# Altium footprint library OBC Development Board.PcbLib: 53 footprints (part 3 of 4)
Each footprint in its own frame and in the unit in brackets; x right, y up, seen from the top. Pads: shape width x height; smd on the part's side, far side on the other; paste and mask are expansions set on the pad; w line width, h text height; cw(c..) or ccw(c..) is an arc to the next point about the centre after c.
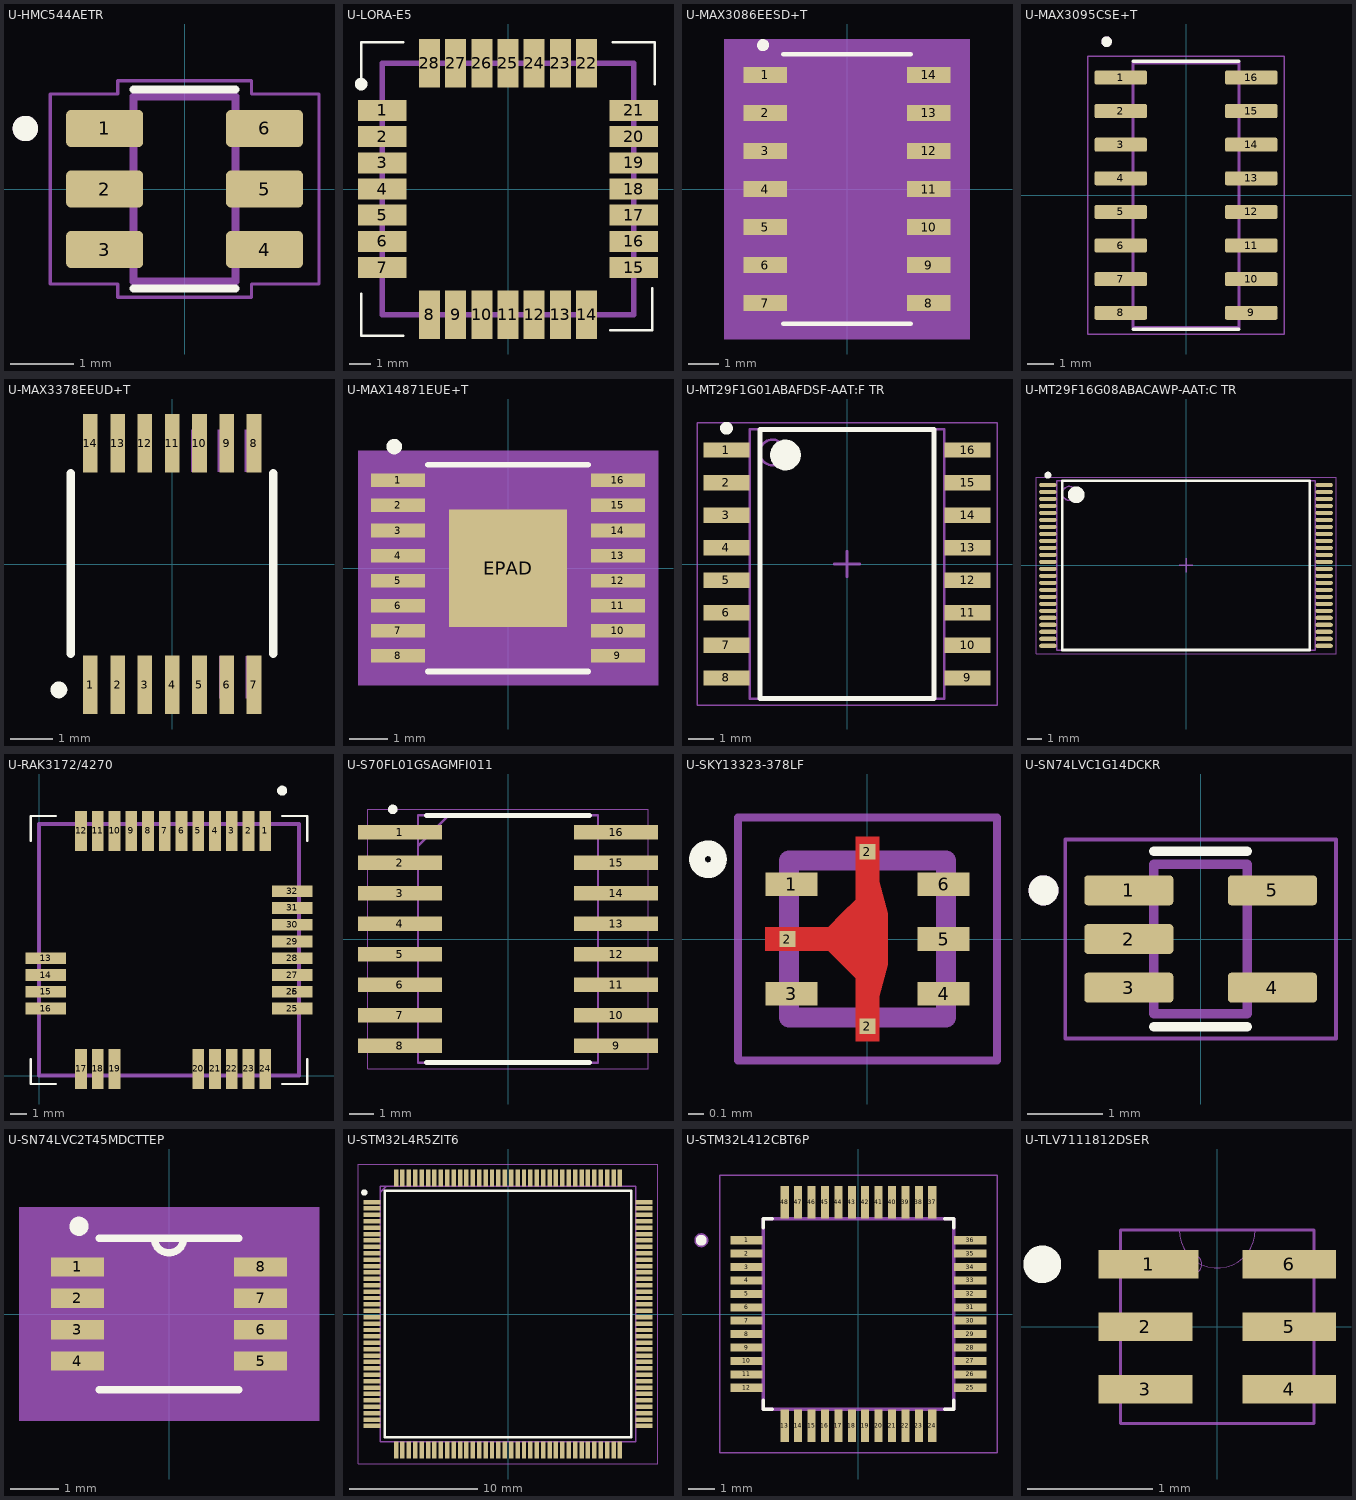
[diagram p2: the footprints below, top view; thin cyan lines are the x and y axes]

## U-HMC544AETR [mm]
pads (6):
  rrect25% 1.21x0.58 smd: 1(-1.255,0.95) 2(-1.255,0) 3(-1.255,-0.95) 4(1.255,-0.95) 5(1.255,0) 6(1.255,0.95)
Top Overlay:
  circle w0.2: c-2.5,0.95 r0.1
  lines w0.127: -0.8,-1.56 0.8,-1.56 ; -0.8,1.56 0.8,1.56
Mechanical 13:
  circle w0.2: c-2.5,0.95 r0.1
  lines w0.127: -0.8,-1.45 0.8,-1.45 0.8,1.45 -0.8,1.45 -0.8,-1.45
Mechanical 15:
  lines w0.05: -2.11,-1.49 -1.05,-1.49 -1.05,-1.7 1.05,-1.7 1.05,-1.49 2.11,-1.49 2.11,1.49 1.05,1.49 1.05,1.7 -1.05,1.7 -1.05,1.49 -2.11,1.49 -2.11,-1.49
3D body "HMC544AE (1).STEP": height 1.45, standoff 0, extent -1.4,-1.45 1.4,1.45

## U-LORA-E5 [mm]
pads (28):
  rrect0% 2.3x1 smd: 1(-6,3.75) 2(-6,2.5) 3(-6,1.25) 4(-6,0) 5(-6,-1.25) 6(-6,-2.5) 7(-6,-3.75) 15(6,-3.75) 16(6,-2.5) 17(6,-1.25) 18(6,0) 19(6,1.25) 20(6,2.5) 21(6,3.75)
  rrect0% 1x2.3 smd: 8(-3.75,-6) 9(-2.5,-6) 10(-1.25,-6) 11(0,-6) 12(1.25,-6) 13(2.5,-6) 14(3.75,-6) 22(3.75,6) 23(2.5,6) 24(1.25,6) 25(0,6) 26(-1.25,6) 27(-2.5,6) 28(-3.75,6)
Top Overlay:
  circle w0.4: c-7,5 r0.1
  lines w0.127: -7,-5 -7,-7 -5,-7 ; -7,5 -7,7 -5,7 ; 4.884,-6.73 6.884,-6.73 6.884,-4.73 ; 5,7 7,7 7,5
Mechanical 13:
  lines w0.254: -6,-6 6,-6 6,6 -6,6 -6,-6
3D body: height 2.5, standoff 0, extent -6,-6 6,6

## U-MAX3086EESD+T [mil]
pads (14):
  rect 57.5x21 smd paste+0 mask+0: 1(-107.25,150) 2(-107.25,100) 3(-107.25,50) 4(-107.25,0) 5(-107.25,-50) 6(-107.25,-100) 7(-107.25,-150) 8(107.25,-150) 9(107.25,-100) 10(107.25,-50) 11(107.25,0) 12(107.25,50) 13(107.25,100) 14(107.25,150)
Top Overlay:
  circle w7.87: c-110.24,188.98 r3.94
  lines w6: -83.5,-177 83.5,-177 ; -83.5,177 83.5,177
Mechanical 5:
  region: 161,-197 -161,-197 -161,197 161,197
Mechanical 13:
  lines w0: -12,172 ccw(c0,172) 12,172
  lines w1: -122,-159.5 -78.5,-159.5 -78.5,-140.5 -122,-140.5 -122,-159.5 ; -122,-109.5 -78.5,-109.5 -78.5,-90.5 -122,-90.5 -122,-109.5 ; -122,-59.5 -78.5,-59.5 -78.5,-40.5 -122,-40.5 -122,-59.5 ; -122,-9.5 -78.5,-9.5 -78.5,9.5 -122,9.5 -122,-9.5 ; -122,40.5 -78.5,40.5 -78.5,59.5 -122,59.5 -122,40.5 ; -122,90.5 -78.5,90.5 -78.5,109.5 -122,109.5 -122,90.5 ; -122,140.5 -78.5,140.5 -78.5,159.5 -122,159.5 -122,140.5 ; -78.5,-172 -78.5,172 78.5,172 78.5,-172 -78.5,-172 ; 78.5,-159.5 122,-159.5 122,-140.5 78.5,-140.5 78.5,-159.5 ; 78.5,-109.5 122,-109.5 122,-90.5 78.5,-90.5 78.5,-109.5 ; 78.5,-59.5 122,-59.5 122,-40.5 78.5,-40.5 78.5,-59.5 ; 78.5,-9.5 122,-9.5 122,9.5 78.5,9.5 78.5,-9.5 ; 78.5,40.5 122,40.5 122,59.5 78.5,59.5 78.5,40.5 ; 78.5,90.5 122,90.5 122,109.5 78.5,109.5 78.5,90.5 ; 78.5,140.5 122,140.5 122,159.5 78.5,159.5 78.5,140.5
  text "*" at -76,119 h50
3D body "21-0041B_14_MXM.step": height 69.09, standoff 0, extent -122.01,-172.01 122.01,172
3D body: height 10, standoff 0, extent 0,0 10,10

## U-MAX3095CSE+T [mm]
pads (16):
  rrect25% 1.98x0.53 smd: 1(-2.465,4.445) 2(-2.465,3.175) 3(-2.465,1.905) 4(-2.465,0.635) 5(-2.465,-0.635) 6(-2.465,-1.905) 7(-2.465,-3.175) 8(-2.465,-4.445) 9(2.465,-4.445) 10(2.465,-3.175) 11(2.465,-1.905) 12(2.465,-0.635) 13(2.465,0.635) 14(2.465,1.905) 15(2.465,3.175) 16(2.465,4.445)
Top Overlay:
  circle w0.2: c-3,5.8 r0.1
  lines w0.127: -2,-5.06 2,-5.06 ; -2,5.06 2,5.06
Mechanical 13:
  circle w0.2: c-3,5.8 r0.1
  lines w0.127: -2,-5 2,-5 2,5 -2,5 -2,-5
Mechanical 15:
  lines w0.05: -3.71,-5.25 3.71,-5.25 3.71,5.25 -3.71,5.25 -3.71,-5.25
3D body "MAX3095CSE+T.STEP": height 1.75, standoff 0, extent -3,-4.95 3,4.95

## U-MAX3378EEUD+T [mm]
pads (14):
  rect 0.35x1.4 smd: 1(-1.95,-2.875) 2(-1.3,-2.875) 3(-0.65,-2.875) 4(0,-2.875) 5(0.65,-2.875) 6(1.3,-2.875) 7(1.95,-2.875) 8(1.95,2.875) 9(1.3,2.875) 10(0.65,2.875) 11(0,2.875) 12(-0.65,2.875) 13(-1.3,2.875) 14(-1.95,2.875)
Top Overlay:
  circle w0.2: c-2.7,-3 r0.1
  lines w0.2: -2.413,-2.141 -2.413,2.159 ; 2.413,-2.141 2.413,2.159
Mechanical 13:
  region: -1.835,-3.2 -2.085,-3.2 -2.085,-2.2 -1.835,-2.2
  region: -1.185,-3.2 -1.435,-3.2 -1.435,-2.2 -1.185,-2.2
  region: -0.535,-3.2 -0.785,-3.2 -0.785,-2.2 -0.535,-2.2
  region: 0.115,-3.2 -0.135,-3.2 -0.135,-2.2 0.115,-2.2
  region: 0.115,2.2 -0.135,2.2 -0.135,3.2 0.115,3.2
  region: -0.535,2.2 -0.785,2.2 -0.785,3.2 -0.535,3.2
  region: -1.185,2.2 -1.435,2.2 -1.435,3.2 -1.185,3.2
  region: -1.835,2.2 -2.085,2.2 -2.085,3.2 -1.835,3.2
  region: 0.735,-3.2 0.485,-3.2 0.485,-2.2 0.735,-2.2
  region: 1.37,-3.2 1.12,-3.2 1.12,-2.2 1.37,-2.2
  region: 2.005,-3.2 1.755,-3.2 1.755,-2.2 2.005,-2.2
  region: 1.34,2.2 1.09,2.2 1.09,3.2 1.34,3.2
  region: 1.975,2.2 1.725,2.2 1.725,3.2 1.975,3.2
  region: 0.705,2.2 0.455,2.2 0.455,3.2 0.705,3.2
3D body "step_temp.STEP": height 1.1, standoff 0, extent -2.5,-3.175 2.5,3.225

## U-MAX14871EUE+T [mm]
pads (17):
  rect 1.4x0.35 smd paste+0 mask+0: 1(-2.845,2.275) 2(-2.845,1.625) 3(-2.845,0.975) 4(-2.845,0.325) 5(-2.845,-0.325) 6(-2.845,-0.975) 7(-2.845,-1.625) 8(-2.845,-2.275) 9(2.845,-2.275) 10(2.845,-1.625) 11(2.845,-0.975) 12(2.845,-0.325) 13(2.845,0.325) 14(2.845,0.975) 15(2.845,1.625) 16(2.845,2.275)
  rect 3.05x3.05 smd paste-1.537 mask+0: EPAD(0,0)
Top Overlay:
  circle w0.2: c-2.946,3.15 r0.1
  lines w0.152: -2.069,-2.68 2.069,-2.68 ; -2.069,2.68 2.069,2.68
Top Paste:
  region: 1.449,-0.1 0.1,-0.1 0.1,-1.449 1.449,-1.449
  region: 1.449,1.449 0.1,1.449 0.1,0.1 1.449,0.1
  region: -0.1,-0.1 -1.449,-0.1 -1.449,-1.449 -0.1,-1.449
  region: -0.1,1.449 -1.449,1.449 -1.449,0.1 -0.1,0.1
Mechanical 5:
  region: 3.886,-3.035 -3.886,-3.035 -3.886,3.035 3.886,3.035
Mechanical 13:
  lines w0: -0.305,2.553 ccw(c0,2.553) 0.305,2.553
  lines w0.025: -3.251,-2.427 -2.248,-2.427 -2.248,-2.123 -3.251,-2.123 -3.251,-2.427 ; -3.251,-1.777 -2.248,-1.777 -2.248,-1.473 -3.251,-1.473 -3.251,-1.777 ; -3.251,-1.127 -2.248,-1.127 -2.248,-0.823 -3.251,-0.823 -3.251,-1.127 ; -3.251,-0.477 -2.248,-0.477 -2.248,-0.173 -3.251,-0.173 -3.251,-0.477 ; -3.251,0.173 -2.248,0.173 -2.248,0.477 -3.251,0.477 -3.251,0.173 ; -3.251,0.823 -2.248,0.823 -2.248,1.127 -3.251,1.127 -3.251,0.823 ; -3.251,1.473 -2.248,1.473 -2.248,1.777 -3.251,1.777 -3.251,1.473 ; -3.251,2.123 -2.248,2.123 -2.248,2.427 -3.251,2.427 -3.251,2.123 ; -2.248,-2.553 -2.248,2.553 2.248,2.553 2.248,-2.553 -2.248,-2.553 ; 2.248,-2.427 3.251,-2.427 3.251,-2.123 2.248,-2.123 2.248,-2.427 ; 2.248,-1.777 3.251,-1.777 3.251,-1.473 2.248,-1.473 2.248,-1.777 ; 2.248,-1.127 3.251,-1.127 3.251,-0.823 2.248,-0.823 2.248,-1.127 ; 2.248,-0.477 3.251,-0.477 3.251,-0.173 2.248,-0.173 2.248,-0.477 ; 2.248,0.173 3.251,0.173 3.251,0.477 2.248,0.477 2.248,0.173 ; 2.248,0.823 3.251,0.823 3.251,1.127 2.248,1.127 2.248,0.823 ; 2.248,1.473 3.251,1.473 3.251,1.777 2.248,1.777 2.248,1.473 ; 2.248,2.123 3.251,2.123 3.251,2.427 2.248,2.427 2.248,2.123
  text "*" at -2.184,1.206 h1.27
3D body "21-0108_U16E+3_MXM.step": height 1.09, standoff -0.05, extent -3.251,-2.553 3.251,2.553

## U-MT29F1G01ABAFDSF-AAT:F TR [mm]
height 2.65
pads (16):
  rect 1.8x0.6 smd: 1(-4.7,4.445) 2(-4.7,3.175) 3(-4.7,1.905) 4(-4.7,0.635) 5(-4.7,-0.635) 6(-4.7,-1.905) 7(-4.7,-3.175) 8(-4.7,-4.445) 9(4.7,-4.445) 10(4.7,-3.175) 11(4.7,-1.905) 12(4.7,-0.635) 13(4.7,0.635) 14(4.7,1.905) 15(4.7,3.175) 16(4.7,4.445)
Top Overlay:
  circle w0.25: c-4.7,5.295 r0.125
  circle w0.6: c-2.4,4.25 r0.3
  lines w0.2: -3.4,-5.25 -3.4,5.25 3.4,5.25 3.4,-5.25 -3.4,-5.25
Mechanical 13:
  circle w0.1: c-2.9,4.35 r0.5
  lines w0.1: -3.8,-5.25 -3.8,5.25 3.8,5.25 3.8,-5.25 -3.8,-5.25
Mechanical 15:
  lines w0.05: -5.85,-5.5 -5.85,5.5 5.85,5.5 5.85,-5.5 -5.85,-5.5
  lines w0.1: -0.5,0 0.5,0 ; 0,-0.5 0,0.5
3D body "F TR.step": height 2.65, standoff 0, extent -5.15,-5.25 5.15,5.25

## U-MT29F16G08ABACAWP-AAT:C TR [mm] "TSSOP, 48-Leads, Body 12.00x18.40mm, Pitch 0.50mm, IPC Medium Density"
height 1.2
pads (48):
  oval 1.25x0.3 smd: 1(-9.875,5.75) 2(-9.875,5.25) 3(-9.875,4.75) 4(-9.875,4.25) 5(-9.875,3.75) 6(-9.875,3.25) 7(-9.875,2.75) 8(-9.875,2.25) 9(-9.875,1.75) 10(-9.875,1.25) 11(-9.875,0.75) 12(-9.875,0.25) 13(-9.875,-0.25) 14(-9.875,-0.75) 15(-9.875,-1.25) 16(-9.875,-1.75) 17(-9.875,-2.25) 18(-9.875,-2.75) 19(-9.875,-3.25) 20(-9.875,-3.75) 21(-9.875,-4.25) 22(-9.875,-4.75) 23(-9.875,-5.25) 24(-9.875,-5.75) 25(9.875,-5.75) 26(9.875,-5.25) 27(9.875,-4.75) 28(9.875,-4.25) 29(9.875,-3.75) 30(9.875,-3.25) 31(9.875,-2.75) 32(9.875,-2.25) 33(9.875,-1.75) 34(9.875,-1.25) 35(9.875,-0.75) 36(9.875,-0.25) 37(9.875,0.25) 38(9.875,0.75) 39(9.875,1.25) 40(9.875,1.75) 41(9.875,2.25) 42(9.875,2.75) 43(9.875,3.25) 44(9.875,3.75) 45(9.875,4.25) 46(9.875,4.75) 47(9.875,5.25) 48(9.875,5.75)
Top Overlay:
  circle w0.25: c-9.875,6.45 r0.125
  circle w0.6: c-7.85,5.05 r0.3
  lines w0.2: -8.85,-6.05 -8.85,6.05 8.85,6.05 8.85,-6.05 -8.85,-6.05
Mechanical 13:
  circle w0.1: c-8.35,5.15 r0.5
  lines w0.1: -9.25,-6.05 -9.25,6.05 9.25,6.05 9.25,-6.05 -9.25,-6.05
Mechanical 15:
  lines w0.05: -10.725,-6.3 -10.725,6.3 10.725,6.3 10.725,-6.3 -10.725,-6.3
  lines w0.1: -0.5,0 0.5,0 ; 0,-0.5 0,0.5
3D body "C TR 1.step": height 1.2, standoff 0, extent -10,-6.05 10,6.05

## U-RAK3172/4270 [mm]
pads (33):
  rrect0% 0.7x2.4 smd: 1(13.5,14.6) 2(12.5,14.6) 3(11.5,14.6) 4(10.5,14.6) 5(9.5,14.6) 6(8.5,14.6) 7(7.5,14.6) 8(6.5,14.6) 9(5.5,14.6) 10(4.5,14.6) 11(3.5,14.6) 12(2.5,14.6) 17(2.5,0.4) 18(3.5,0.4) 19(4.5,0.4) 20(9.5,0.4) 21(10.5,0.4) 22(11.5,0.4) 23(12.5,0.4) 24(13.5,0.4)
  rrect0% 2.4x0.7 smd: 13(0.4,7) 14(0.4,6) 15(0.4,5) 16(0.4,4) 25(15.1,4) 25(15.1,5) 26(15.1,5) 27(15.1,6) 28(15.1,7) 29(15.1,8) 30(15.1,9) 31(15.1,10) 32(15.1,11)
Top Overlay:
  circle w0.4: c14.5,17 r0.1
  lines w0.127: -0.5,1 -0.5,-0.5 1,-0.5 ; -0.5,14 -0.5,15.5 1,15.5 ; 14.5,-0.5 16,-0.5 16,1 ; 14.5,15.5 16,15.5 16,14
Mechanical 13:
  lines w0.254: -0.001,0.019 -0.001,15.019 15.499,15.019 ; 0,0 15.5,0 15.5,15
3D body: height 1.27, standoff -1.27, extent 0,0 15.5,15

## U-S70FL01GSAGMFI011 [mm]
pads (16):
  rect 3.5x0.6 smd: 1(-4.5,4.445) 2(-4.5,3.175) 3(-4.5,1.905) 4(-4.5,0.635) 5(-4.5,-0.635) 6(-4.5,-1.905) 7(-4.5,-3.175) 8(-4.5,-4.445) 9(4.5,-4.445) 10(4.5,-3.175) 11(4.5,-1.905) 12(4.5,-0.635) 13(4.5,0.635) 14(4.5,1.905) 15(4.5,3.175) 16(4.5,4.445)
Top Overlay:
  circle w0.2: c-4.8,5.4 r0.1
  lines w0.2: -3.4,-5.15 3.4,-5.15 ; -3.4,5.15 3.4,5.15
Mechanical 13:
  lines w0.1: -3.75,3.88 -2.48,5.15 ; -3.75,-5.15 3.75,-5.15 3.75,5.15 -3.75,5.15 -3.75,-5.15
Mechanical 15:
  lines w0.05: -5.85,-5.4 5.85,-5.4 5.85,5.4 -5.85,5.4 -5.85,-5.4
3D body "S70FL01GSAGMFI011.stp": height 2.65, standoff 0, extent -5.15,-5.15 5.15,5.15

## U-SKY13323-378LF [mm]
pads (8):
  rect 0.33x0.15 smd: 1(-0.485,0.35) 3(-0.485,-0.35) 4(0.485,-0.35) 5(0.485,0) 6(0.485,0.35)
  rect 0.1x0.1 smd paste-1 mask+0: 2(-0.51,0) 2(0,-0.555) 2(0,0.555)
Top Layer:
  region: 0.075,0.365 -0.075,0.25 -0.075,0.65 0.075,0.65
  region: 0.075,-0.65 -0.075,-0.65 -0.075,-0.365 0.075,-0.365
  region: 0.13,0.165 0.13,-0.165 0.075,-0.365 -0.075,-0.365 -0.075,-0.25 -0.25,-0.075 -0.25,0.075 -0.162,0.162 -0.075,0.25 0.075,0.365
  region: -0.25,-0.075 -0.65,-0.075 -0.65,0.075 -0.25,0.075
Top Overlay:
  circle w0.1: c-1.016,0.508 r0.07
Top Paste:
  region: 0.075,0.365 -0.075,0.25 -0.075,0.65 0.075,0.65
  region: 0.075,-0.65 -0.075,-0.65 -0.075,-0.365 0.075,-0.365
  region: 0.13,0.165 0.13,-0.165 0.075,-0.365 -0.075,-0.365 -0.075,-0.25 -0.25,-0.075 -0.25,0.075 -0.162,0.162 -0.075,0.25 0.075,0.365
  region: -0.25,-0.075 -0.65,-0.075 -0.65,0.075 -0.25,0.075
Top Solder:
  region: 0.1,0.375 0.15,0.175 0.15,-0.175 0.1,-0.375 0.1,-0.675 -0.1,-0.675 -0.1,-0.25 -0.25,-0.1 -0.675,-0.1 -0.675,0.1 -0.25,0.1 -0.1,0.25 -0.1,0.675 0.1,0.675
Mechanical 13:
  lines w0.127: -0.5,-0.5 0.5,-0.5 0.5,0.5 -0.5,0.5 -0.5,-0.5
Mechanical 15:
  lines w0.05: -0.825,-0.775 0.825,-0.775 0.825,0.775 -0.825,0.775 -0.825,-0.775
3D body "SKY13323-378LF.STEP": height 0.5, standoff 0, extent -0.5,-0.5 0.5,0.5

## U-SN74LVC1G14DCKR [mm]
pads (5):
  rrect25% 1.19x0.4 smd: 1(-0.96,0.65) 2(-0.96,0) 3(-0.96,-0.65) 4(0.96,-0.65) 5(0.96,0.65)
Top Overlay:
  circle w0.2: c-2.1,0.65 r0.1
  lines w0.127: -0.625,-1.17 0.625,-1.17 ; -0.625,1.17 0.625,1.17
Mechanical 13:
  circle w0.2: c-2.1,0.65 r0.1
  lines w0.127: -0.625,-1 -0.625,1 0.625,1 0.625,-1 -0.625,-1
Mechanical 15:
  lines w0.05: -1.81,-1.33 -1.81,1.33 1.81,1.33 1.81,-1.33 -1.81,-1.33
3D body "SN74LVC1G14DCKR.STEP": height 1.1, standoff 0, extent -1.05,-1 1.05,1

## U-SN74LVC2T45MDCTTEP [mm]
pads (8):
  rect 1.1x0.4 smd: 1(-1.9,0.975) 2(-1.9,0.325) 3(-1.9,-0.325) 4(-1.9,-0.975) 5(1.9,-0.975) 6(1.9,-0.325) 7(1.9,0.325) 8(1.9,0.975)
Top Overlay:
  circle w0.2: c-1.867,1.819 r0.1
  lines w0.152: -1.448,-1.575 1.448,-1.575 ; -1.448,1.575 1.448,1.575 ; -0.305,1.575 ccw(c0,1.575) 0.305,1.575
Mechanical 5:
  region: 3.111,-2.21 -3.111,-2.21 -3.111,2.21 3.111,2.21
Mechanical 13:
  lines w0: -0.305,1.575 ccw(c0,1.575) 0.305,1.575
  lines w0.025: -2.121,-1.127 -1.448,-1.127 -1.448,-0.823 -2.121,-0.823 -2.121,-1.127 ; -2.121,-0.477 -1.448,-0.477 -1.448,-0.173 -2.121,-0.173 -2.121,-0.477 ; -2.121,0.173 -1.448,0.173 -1.448,0.477 -2.121,0.477 -2.121,0.173 ; -2.121,0.823 -1.448,0.823 -1.448,1.127 -2.121,1.127 -2.121,0.823 ; -1.448,-1.575 -1.448,1.575 1.448,1.575 1.448,-1.575 -1.448,-1.575 ; 1.448,-1.127 2.121,-1.127 2.121,-0.823 1.448,-0.823 1.448,-1.127 ; 1.448,-0.477 2.121,-0.477 2.121,-0.173 1.448,-0.173 1.448,-0.477 ; 1.448,0.173 2.121,0.173 2.121,0.477 1.448,0.477 1.448,0.173 ; 1.448,0.823 2.121,0.823 2.121,1.127 1.448,1.127 1.448,0.823
  text "*" at -2.267,1.204 h1.27
Mechanical 15:
  region: 2.73,-1.829 -2.73,-1.829 -2.73,1.829 2.73,1.829
  lines w0.152: -2.73,-1.829 2.73,-1.829 2.73,1.829 -2.73,1.829 -2.73,-1.829
3D body: height 0.25, standoff 0, extent 0,0 0.254,0.254
3D body "DCT0008A.stp": height 0.91, standoff 0, extent -2.01,-1.475 2.011,1.475

## U-STM32L4R5ZIT6 [mm]
pads (144):
  rect 1.35x0.35 smd mask+0.051: 1(-10.625,8.75) 2(-10.625,8.25) 3(-10.625,7.75) 4(-10.625,7.25) 5(-10.625,6.75) 6(-10.625,6.25) 7(-10.625,5.75) 8(-10.625,5.25) 9(-10.625,4.75) 10(-10.625,4.25) 11(-10.625,3.75) 12(-10.625,3.25) 13(-10.625,2.75) 14(-10.625,2.25) 15(-10.625,1.75) 17(-10.625,0.75) 18(-10.625,0.25) 19(-10.625,-0.25) 20(-10.625,-0.75) 21(-10.625,-1.25) 22(-10.625,-1.75) 23(-10.625,-2.25) 24(-10.625,-2.75) 25(-10.625,-3.25) 26(-10.625,-3.75) 27(-10.625,-4.25) 28(-10.625,-4.75) 29(-10.625,-5.25) 30(-10.625,-5.75) 31(-10.625,-6.25) 32(-10.625,-6.75) 33(-10.625,-7.25) 34(-10.625,-7.75) 35(-10.625,-8.25) 36(-10.625,-8.75) 73(10.625,-8.75) 74(10.625,-8.25) 75(10.625,-7.75) 76(10.625,-7.25) 77(10.625,-6.75) 78(10.625,-6.25) 79(10.625,-5.75) 80(10.625,-5.25) 81(10.625,-4.75) 82(10.625,-4.25) 83(10.625,-3.75) 84(10.625,-3.25) 85(10.625,-2.75) 86(10.625,-2.25) 87(10.625,-1.75) 88(10.625,-1.25) 89(10.625,-0.75) 90(10.625,-0.25) 91(10.625,0.25) 92(10.625,0.75) 93(10.625,1.25) 94(10.625,1.75) 95(10.625,2.25) 96(10.625,2.75) 97(10.625,3.25) 98(10.625,3.75) 99(10.625,4.25) 100(10.625,4.75) 101(10.625,5.25) 102(10.625,5.75) 103(10.625,6.25) 104(10.625,6.75) 105(10.625,7.25) 106(10.625,7.75) 107(10.625,8.25) 108(10.625,8.75)
  rect 1.35x0.35 smd paste+0 mask+0.051: 16(-10.625,1.25)
  rect 0.35x1.35 smd mask+0.051: 37(-8.75,-10.625) 38(-8.25,-10.625) 39(-7.75,-10.625) 40(-7.25,-10.625) 41(-6.75,-10.625) 42(-6.25,-10.625) 43(-5.75,-10.625) 44(-5.25,-10.625) 45(-4.75,-10.625) 46(-4.25,-10.625) 47(-3.75,-10.625) 48(-3.25,-10.625) 49(-2.75,-10.625) 50(-2.25,-10.625) 51(-1.75,-10.625) 52(-1.25,-10.625) 53(-0.75,-10.625) 54(-0.25,-10.625) 55(0.25,-10.625) 56(0.75,-10.625) 57(1.25,-10.625) 58(1.75,-10.625) 59(2.25,-10.625) 60(2.75,-10.625) 61(3.25,-10.625) 62(3.75,-10.625) 63(4.25,-10.625) 64(4.75,-10.625) 65(5.25,-10.625) 66(5.75,-10.625) 67(6.25,-10.625) 68(6.75,-10.625) 69(7.25,-10.625) 70(7.75,-10.625) 71(8.25,-10.625) 72(8.75,-10.625) 109(8.75,10.625) 110(8.25,10.625) 111(7.75,10.625) 112(7.25,10.625) 113(6.75,10.625) 114(6.25,10.625) 115(5.75,10.625) 116(5.25,10.625) 117(4.75,10.625) 118(4.25,10.625) 119(3.75,10.625) 120(3.25,10.625) 121(2.75,10.625) 122(2.25,10.625) 123(1.75,10.625) 124(1.25,10.625) 125(0.75,10.625) 126(0.25,10.625) 127(-0.25,10.625) 128(-0.75,10.625) 129(-1.25,10.625) 130(-1.75,10.625) 131(-2.25,10.625) 132(-2.75,10.625) 133(-3.25,10.625) 134(-3.75,10.625) 135(-4.25,10.625) 136(-4.75,10.625) 137(-5.25,10.625) 138(-5.75,10.625) 139(-6.25,10.625) 140(-6.75,10.625) 141(-7.25,10.625) 142(-7.75,10.625) 143(-8.25,10.625) 144(-8.75,10.625)
Top Overlay:
  circle w0.25: c-11.225,9.5 r0.125
  lines w0.2: -9.65,-9.65 9.65,-9.65 9.65,9.65 -9.65,9.65 -9.65,-9.65
Mechanical 13:
  lines w0.1: -10,9.5 -9.5,10 ; -10,-10 10,-10 10,10 -10,10 -10,-10
Mechanical 15:
  lines w0.05: -11.725,-11.725 11.725,-11.725 11.725,11.725 -11.725,11.725 -11.725,-11.725
3D body "STM32L4R5ZIT6.stp": height 1.6, standoff 0, extent -11,-11 11,11

## U-STM32L412CBT6P [mm]
pads (48):
  rrect0% 1.2x0.3 smd: 1(-4.17,2.75) 2(-4.17,2.25) 3(-4.17,1.75) 4(-4.17,1.25) 5(-4.17,0.75) 6(-4.17,0.25) 7(-4.17,-0.25) 8(-4.17,-0.75) 9(-4.17,-1.25) 10(-4.17,-1.75) 11(-4.17,-2.25) 12(-4.17,-2.75) 25(4.17,-2.75) 26(4.17,-2.25) 27(4.17,-1.75) 28(4.17,-1.25) 29(4.17,-0.75) 30(4.17,-0.25) 31(4.17,0.25) 32(4.17,0.75) 33(4.17,1.25) 34(4.17,1.75) 35(4.17,2.25) 36(4.17,2.75)
  rrect0% 0.3x1.2 smd: 13(-2.75,-4.17) 14(-2.25,-4.17) 15(-1.75,-4.17) 16(-1.25,-4.17) 17(-0.75,-4.17) 18(-0.25,-4.17) 19(0.25,-4.17) 20(0.75,-4.17) 21(1.25,-4.17) 22(1.75,-4.17) 23(2.25,-4.17) 24(2.75,-4.17) 37(2.75,4.17) 38(2.25,4.17) 39(1.75,4.17) 40(1.25,4.17) 41(0.75,4.17) 42(0.25,4.17) 43(-0.25,4.17) 44(-0.75,4.17) 45(-1.25,4.17) 46(-1.75,4.17) 47(-2.25,4.17) 48(-2.75,4.17)
Top Overlay:
  circle w0.2: c-5.86,2.75 r0.1
  lines w0.127: -3.55,-3.21 -3.55,-3.55 -3.21,-3.55 ; -3.55,3.21 -3.55,3.55 -3.21,3.55 ; 3.21,-3.55 3.55,-3.55 3.55,-3.21 ; 3.21,3.55 3.55,3.55 3.55,3.21
Mechanical 13:
  circle w0.2: c-5.86,2.75 r0.162
  lines w0.127: -3.55,-3.55 3.55,-3.55 3.55,3.55 -3.55,3.55 -3.55,-3.55
Mechanical 15:
  lines w0.05: -5.165,-5.165 5.165,-5.165 5.165,5.165 -5.165,5.165 -5.165,-5.165
3D body "STM32L412CBT6P.STEP": height 1.59, standoff -0.01, extent -4.5,-4.5 4.5,4.5

## U-TLV7111812DSER [mm]
pads (12):
  rect 0.8x0.23 smd paste-0.14 mask+0: 1(-0.55,0.5)
  rect 0.75x0.23 smd paste-0.14 mask+0: 2(-0.575,0) 3(-0.575,-0.5) 4(0.575,-0.5) 5(0.575,0) 6(0.575,0.5)
  rect 0.75x0.23 on Top Paste paste-0.14 mask+0: ""(-0.575,-0.5) ""(-0.575,0) ""(0.575,-0.5) ""(0.575,0) ""(0.575,0.5)
  rect 0.8x0.23 on Top Paste paste-0.14 mask+0: ""(-0.55,0.5)
Top Overlay:
  circle w0.2: c-1.4,0.5 r0.051
Mechanical 13:
  circle w0: c-0.2,0.5 r0.076
  lines w0: -0.305,0.775 ccw(c0,0.775) 0.305,0.775
  lines w0.025: -0.775,-0.775 -0.775,0.775 0.775,0.775 0.775,-0.775 -0.775,-0.775
3D body "DSE6_TEX.step": height 0.8, standoff 0, extent -0.775,-0.775 0.775,0.775